# Altium footprint library SparkFun-Retired.PCBLIB: 302 footprints (part 8 of 19)
Each footprint in its own frame and in the unit in brackets; x right, y up, seen from the top. Pads: shape width x height; smd on the part's side, far side on the other; paste and mask are expansions set on the pad; w line width, h text height; cw(c..) or ccw(c..) is an arc to the next point about the centre after c.
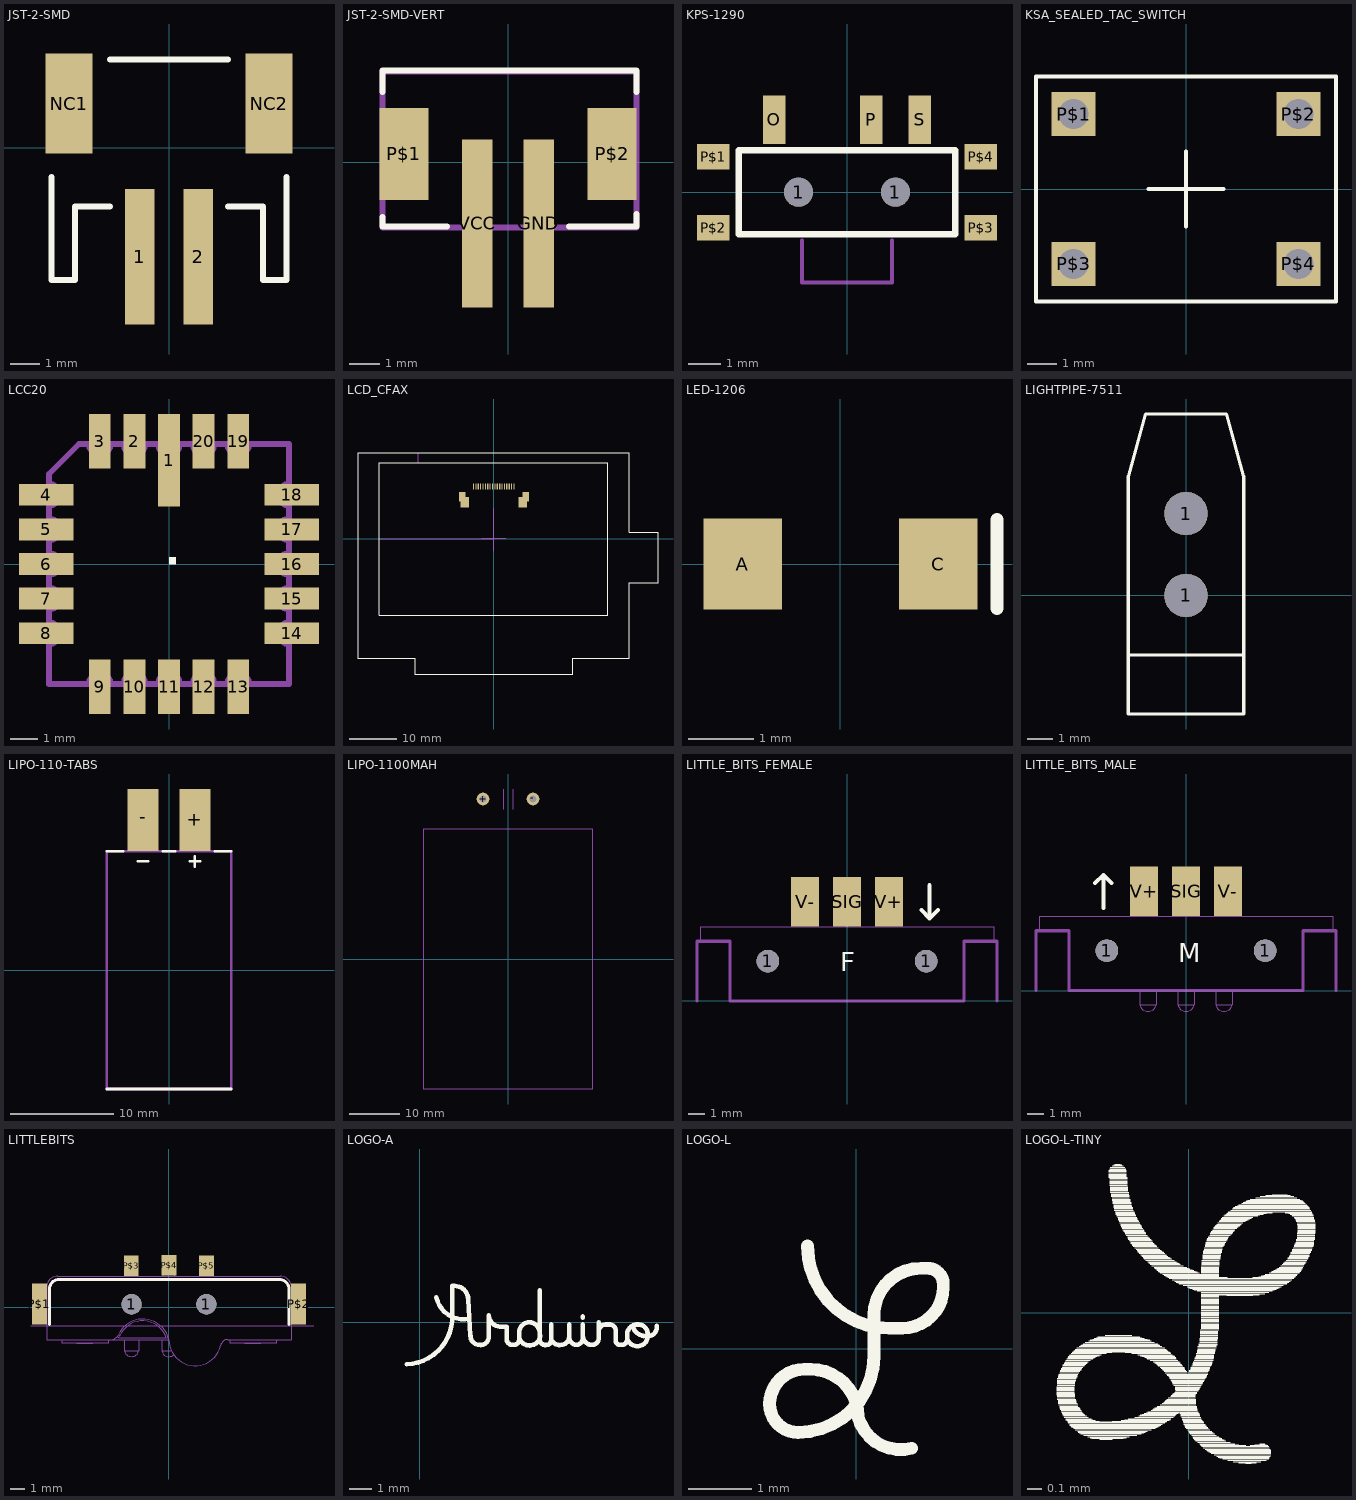
[diagram p7: the footprints below, top view; thin cyan lines are the x and y axes]

## JST-2-SMD [mm]
pads (4):
  rect 1x4.6 smd: 1(-1,-3.7) 2(1,-3.7)
  rect 1.6x3.4 smd: NC1(-3.4,1.5) NC2(3.4,1.5)
Top Overlay:
  lines w0.203: -4,-1 -4,-4.5 -3.2,-4.5 -3.2,-2 -2,-2 ; -2,3 2,3 ; 2,-2 3.2,-2 3.2,-4.5 4,-4.5 4,-1

## JST-2-SMD-VERT [mm]
pads (4):
  rect 1x5.5 smd: GND(1,-2) VCC(-1,-2)
  rect 1.6x3 smd: P$1(-3.4,0.27) P$2(3.4,0.27)
Top Overlay:
  lines w0.203: -4.1,-1.8 -4.1,-2.1 -2,-2.1 ; -4.1,2.3 -4.1,3 4.2,3 4.2,2.3 ; 2,-2.1 4.2,-2.1 4.2,-1.7
Mechanical 16:
  lines w0.203: -4.1,-2.13 4.2,-2.13 4.2,2.97 -4.1,2.97 -4.1,-2.13

## KPS-1290 [mil]
pads (9):
  round 35.43 hole 35.43: 1(-59.06,0) 1(59.06,0)
  rect 27.56x59.06 smd: O(-88.58,88.58) P(29.53,88.58) S(88.58,88.58)
  rect 39.37x31.5 smd: P$1(-163.39,43.31) P$2(-163.39,-43.31) P$3(163.39,-43.31) P$4(163.39,43.31)
Top Overlay:
  lines w8: -131.89,-51.18 -131.89,51.18 131.89,51.18 131.89,-51.18 -131.89,-51.18
Mechanical 16:
  lines w5: -55.12,-59.06 -55.12,-110.24 55.12,-110.24 55.12,-59.06

## KSA_SEALED_TAC_SWITCH [mm]
pads (4):
  rect 1.5x1.5 hole 1: P$1(-3.81,2.54) P$2(3.81,2.54) P$3(-3.81,-2.54) P$4(3.81,-2.54)
Top Overlay:
  lines w0.127: -1.27,0 1.27,0 ; 0,-1.27 0,1.27 ; -5.08,-3.81 5.08,-3.81 5.08,3.81 -5.08,3.81 -5.08,-3.81

## LCC20 [mil]
pads (20):
  rect 31.5x133.86 smd: 1(0,149.61)
  rect 31.5x78.74 smd: 2(-50,177.17) 3(-100,177.17) 9(-100,-177.17) 10(-50,-177.17) 11(0,-177.17) 12(50,-177.17) 13(100,-177.17) 19(100,177.17) 20(50,177.17)
  rect 78.74x31.5 smd: 4(-177.17,100) 5(-177.17,50) 6(-177.17,0) 7(-177.17,-50) 8(-177.17,-100) 14(177.17,-100) 15(177.17,-50) 16(177.17,0) 17(177.17,50) 18(177.17,100)
Top Overlay:
  region: 0,0 10,0 10,10 0,10
Mechanical 16:
  lines w8: -173.23,-173.62 -173.23,-173.23 ; -173.23,-115.75 -173.23,-173.23 ; -173.23,-84.25 -173.23,-65.75 ; -173.23,-34.25 -173.23,-15.75 ; -173.23,15.75 -173.23,34.25 ; -173.23,65.75 -173.23,84.25 ; -173.23,115.75 -173.23,129.92 -129.92,173.23 -115.75,173.23 ; -173.17,-115.75 ccw(c-173.17,-100) -173.17,-84.25 ; -173.17,-65.75 ccw(c-173.17,-50) -173.17,-34.25 ; -173.17,-15.75 ccw(c-173.17,0) -173.17,15.75 ; -173.17,34.25 ccw(c-173.17,50) -173.17,65.75 ; -173.17,84.25 ccw(c-173.17,100) -173.17,115.75 ; -115.75,-173.23 -173.23,-173.23 ; -115.75,-173.17 cw(c-100,-173.17) -84.25,-173.17 ; -115.75,173.17 ccw(c-100,173.17) -84.25,173.17 ; -84.25,-173.23 -65.75,-173.23 ; -84.25,173.23 -65.75,173.23 ; -65.75,-173.17 cw(c-50,-173.17) -34.25,-173.17 ; -65.75,173.17 ccw(c-50,173.17) -34.25,173.17 ; -34.25,-173.23 -15.75,-173.23 ; -34.25,173.23 -15.75,173.23 ; -15.75,-173.17 cw(c0,-173.17) 15.75,-173.17 ; -15.75,173.17 ccw(c0,173.17) 15.75,173.17 ; 15.75,-173.23 34.25,-173.23 ; 15.75,173.23 34.25,173.23 ; 34.25,-173.17 cw(c50,-173.17) 65.75,-173.17 ; 34.25,173.17 ccw(c50,173.17) 65.75,173.17 ; 65.75,-173.23 84.25,-173.23 ; 65.75,173.23 84.25,173.23 ; 84.25,-173.17 cw(c100,-173.17) 115.75,-173.17 ; 84.25,173.17 ccw(c100,173.17) 115.75,173.17 ; 115.75,-173.23 173.23,-173.23 173.23,-115.75 ; 115.75,173.23 173.23,173.23 173.23,115.75 ; 173.17,-115.75 cw(c173.17,-100) 173.17,-84.25 ; 173.17,-65.75 cw(c173.17,-50) 173.17,-34.25 ; 173.17,-15.75 cw(c173.17,0) 173.17,15.75 ; 173.17,34.25 cw(c173.17,50) 173.17,65.75 ; 173.17,84.25 cw(c173.17,100) 173.17,115.75 ; 173.23,-84.25 173.23,-65.75 ; 173.23,-34.25 173.23,-15.75 ; 173.23,15.75 173.23,34.25 ; 173.23,65.75 173.23,84.25

## LCD_CFAX [mm]
pads (22):
  rect 0.25x1.3 smd: P$1(-4.25,11.05) P$2(-3.75,11.05) P$3(-3.25,11.05) P$4(-2.75,11.05) P$5(-2.25,11.05) P$6(-1.75,11.05) P$7(-1.25,11.05) P$8(-0.75,11.05) P$9(-0.25,11.05) P$10(0.25,11.05) P$11(0.75,11.05) P$12(1.25,11.05) P$13(1.75,11.05) P$14(2.25,11.05) P$15(2.75,11.05) P$16(3.25,11.05) P$17(3.75,11.05) P$18(4.25,11.05)
  rect 1.4x2 smd: P$19(-6.6,8.85) P$20(6.7,8.85)
  rect 1.8x2.2 smd: P$21(6.1,7.75) P$22(-6.1,7.75)
Top Overlay:
  lines w0.203: -28.5,-25 -28.5,18 28.5,18 28.5,1.46 34.5,1.46 34.5,-9.175 28.5,-9.175 28.5,-25 16.5,-25 16.5,-28.5 -16.5,-28.5 -16.5,-25 -28.5,-25 ; -24,-16 -24,16 24,16 24,-16 -24,-16
Mechanical 16:
  lines w0.127: -24,0 0,0 ; -15.9,16 -15.9,18 ; -2.54,0 2.54,0 ; 0,-2.54 0,6.54

## LED-1206 [mil]
pads (2):
  rect 47.24x55.12 smd: A(-59.06,0) C(59.06,0)
Top Overlay:
  lines w8: 94.49,-26.87 94.49,26.87

## LIGHTPIPE-7511 [mil]
pads (2):
  round 66 hole 66: 1(0,0) 1(0,125)
Top Overlay:
  lines w5: -88,-91 -88,-181 88,-181 88,-91 ; -88,-91 -88,182 -62,277 62,277 88,182 88,-91 ; -88,-91 88,-91

## LIPO-110-TABS [mm]
pads (2):
  rect 3x6 smd: +(2.5,14.5) -(-2.5,14.5)
Top Overlay:
  lines w0.254: -6,-11.5 6,-11.5 ; -6,11.5 -4.414,11.5 ; -3,10.5 -2,10.5 ; -0.6,11.5 0.586,11.5 ; 2,10.5 3,10.5 ; 2.5,10 2.5,11 ; 4.414,11.5 6,11.5
Mechanical 16:
  rectangle: -3.5,11.5 -1.5,16.5
  rectangle: 1.5,11.5 3.5,16.5
  lines w0.254: -6,-11.5 6,-11.5 6,11.5 -6,11.5 -6,-11.5

## LIPO-1100MAH [mil]
pads (2):
  round 100 hole 55: +(-196.85,1259.84) -(196.85,1259.84)
Mechanical 16:
  lines w5: -39.37,1181.1 -39.37,1338.58 ; 39.37,1181.1 39.37,1338.58
  lines w8: -669.29,-1023.62 669.29,-1023.62 669.29,1023.62 -669.29,1023.62 -669.29,-1023.62

## LITTLE_BITS_FEMALE [mm]
pads (5):
  round 1.37 hole 1.37: 1(-4.79,2.41) 1(4.79,2.41)
  rect 1.7x3 smd: SIG(0,6) V+(2.54,6) V-(-2.54,6)
Top Overlay:
  lines w0.25: 4.5,5.5 5,5 ; 5,7 5,5 ; 5.5,5.5 5,5
  text "F" at -0.4,1.4 h1.97
Mechanical 1:
  lines w0.203: -9.075,0 -9.075,3.61 -7.075,3.61 -7.075,0 7.075,0 7.075,3.61 9.075,3.61 9.075,0
Mechanical 16:
  lines w0.001: -8.875,3.61 -8.875,4.5 8.875,4.5 8.875,3.61

## LITTLE_BITS_MALE [mm]
pads (5):
  round 1.37 hole 1.37: 1(-4.79,2.41) 1(4.79,2.41)
  rect 1.7x3 smd: SIG(0,6) V+(-2.54,6) V-(2.54,6)
Top Overlay:
  lines w0.25: -5.5,6.5 -5,7 ; -5,5 -5,7 ; -4.5,6.5 -5,7
  text "M" at -0.483,1.321 h1.97
Mechanical 1:
  lines w0.203: -9.075,0 -9.075,3.61 -7.075,3.61 -7.075,0 7.075,0 7.075,3.61 9.075,3.61 9.075,0
Mechanical 16:
  lines w0: -2.797,-0.104 -2.797,-0.866 ; -1.806,-0.104 -1.806,-0.866 ; -0.485,-0.104 -0.485,-0.866 ; 0.505,-0.104 0.505,-0.866 ; 1.801,-0.104 1.801,-0.866 ; 2.791,-0.104 2.791,-0.866 ; -2.797,-0.866 -1.806,-0.866 ; -2.797,-0.866 ccw(c-2.301,-0.753) -1.806,-0.866 ; -0.485,-0.866 0.505,-0.866 ; -0.485,-0.866 ccw(c0.01,-0.753) 0.505,-0.866 ; 1.801,-0.866 2.791,-0.866 ; 1.801,-0.866 ccw(c2.296,-0.753) 2.791,-0.866
  lines w0.001: -8.875,3.61 -8.875,4.5 8.875,4.5 8.875,3.61

## LITTLEBITS [mil]
pads (7):
  round 54.09 hole 54.09: 1(-99,8.5) 1(101,8.5)
  rect 40x109 smd: P$1(-346,9.5) P$2(348,9.5)
  rect 40x55 smd: P$3(-100,111.5) P$4(1,112.5) P$5(101,111.5)
Top Overlay:
  lines w8: -319,-45.5 -319,49.5 cw(c-294,49.5) -294,74.5 297,74.5 cw(c297,49.5) 322,49.5 322,-45.5
Mechanical 16:
  circle w1: c-99.19,9.03 r25
  circle w1: c-99.19,9.03 r15
  circle w1: c100.82,9.03 r25
  circle w1: c100.82,9.03 r15
  lines w0: -369,-49.5 389,-49.5 ; -326.69,59.03 -326.69,-40.97 ; -286.69,-85.97 -286.69,-95.97 -161.69,-95.97 -161.69,-85.97 ; -245.85,-95.97 -245.85,-96.97 -204.19,-96.97 -204.19,-95.97 ; -236.48,-96.97 -236.48,-95.97 ; -210.43,-96.97 -210.43,-95.97 ; -137.44,-77.97 -133.44,-80.97 ; -118.69,-85.97 -118.69,-115.97 ; -114.19,84.03 -114.19,134.03 -84.19,134.03 -84.19,84.03 ; -79.69,-85.97 -79.69,-115.97 ; -14.19,84.03 -14.19,134.03 15.82,134.03 15.82,84.03 ; -1.41,-79.42 -5.87,-80.97 ; 0.83,-85.97 0.82,-85.97 ; 7.64,-115.97 -18.69,-115.97 ; 13.94,-126.62 cw(c0.81,-111.52) -18.69,-115.97 ; 85.82,84.03 85.82,134.03 115.82,134.03 115.82,84.03 ; 328.32,-40.97 363.32,-40.97 363.32,-3.47 cw(c363.32,9.03) 363.32,21.53 363.32,59.03 328.32,59.03 ; -326.69,-40.97 -326.69,-85.97 -153.44,-85.97 ; -326.69,-40.97 -361.69,-40.97 -361.69,-3.47 ccw(c-361.69,9.03) -361.69,21.53 -361.69,59.03 -326.26,59.03 cw(c-296.68,54.04) -296.69,84.03 115.82,84.03 ; -153.44,-85.97 -18.69,-85.97 ; -153.44,-85.97 ccw(c-153.44,-65.97) -135.13,-74.02 ; -135.13,-74.02 -130.56,-76.03 ; -135.13,-74.02 -135.14,-74.02 ; -135.14,-74.02 cw(c-69.18,-103.02) 0.82,-85.97 ; -133.44,-80.97 -5.87,-80.97 ; -133.44,-80.97 ccw(c-153.44,-66) -130.56,-76.03 ; -130.56,-76.03 cw(c-69.19,-103.02) -5.87,-80.97 ; -118.69,-115.97 -79.69,-115.97 ; -118.69,-115.97 ccw(c-99.19,-111.53) -79.69,-115.97 ; -18.69,-115.97 -18.69,-85.97 ; -18.69,-85.97 0.82,-85.97 ; 0.82,-85.97 ccw(c70.81,-85.97) 139.06,-101.52 cw(c158.57,-105.97) 158.57,-85.97 163.32,-85.97 ; 115.82,84.03 298.32,84.03 cw(c298.31,54.03) 327.9,59.03 328.32,59.03 ; 163.32,-85.97 288.32,-85.97 ; 163.32,-85.97 163.32,-95.97 204.15,-95.97 ; 204.15,-95.97 213.52,-95.97 ; 204.15,-95.97 204.15,-96.97 213.52,-96.97 ; 213.52,-96.97 239.57,-96.97 ; 213.52,-96.97 213.52,-95.97 ; 213.52,-95.97 239.57,-95.97 ; 239.57,-96.97 245.82,-96.97 245.82,-95.97 ; 239.57,-96.97 239.57,-95.97 ; 239.57,-95.97 245.82,-95.97 ; 245.82,-95.97 288.32,-95.97 288.32,-85.97 ; 288.32,-85.97 328.32,-85.97 328.32,59.03

## LOGO-A [mil]
Top Overlay:
  lines w8: -22.44,-72.83 ccw(c-25.39,8.86) 56.3,11.81 56.3,62.99 60.24,62.99 cw(c60.24,39.37) 83.86,39.37 87.8,-23.62 ccw(c103.55,-23.62) 103.54,-39.37 ccw(c105.51,-25.59) 119.29,-27.56 119.29,11.81 ccw(c140.94,13.78) 142.91,-7.87 150.79,-7.87 150.79,-29.53 ccw(c160.63,-29.53) 160.63,-39.37 ; 28.74,43.31 ccw(c75.98,53.16) 85.83,5.91 ; 162.6,-39.37 ccw(c162.6,-29.53) 172.44,-29.53 172.44,-27.56 ; 207.87,-23.62 207.87,55.12 ; 227.56,-31.5 cw(c219.69,-31.5) 219.69,-39.37 cw(c217.72,-29.52) 207.87,-31.5 207.87,-27.56 ; 227.56,-3.94 227.56,-27.56 ccw(c242.32,-24.61) 245.28,-39.37 ccw(c244.29,-24.61) 259.06,-23.62 ; 259.06,-3.94 259.06,-23.62 ; 282.68,-3.94 282.68,-21.65 ; 282.68,7.87 282.68,9.84 ; 310.24,0 310.24,-27.56 ; 359.45,-27.56 cw(c349.61,-29.52) 351.57,-39.37 345.67,-39.37 cw(c347.63,-31.5) 339.76,-29.53 339.76,-13.78 ccw(c328.94,-14.77) 327.95,-3.94 322.05,-3.94 ccw(c322.05,-15.75) 310.24,-15.75 310.24,-27.56 ; 369.29,-5.91 ccw(c390.94,-1.97) 394.88,-23.62 ; 410.63,-5.91 410.63,-11.81 cw(c395.87,-8.86) 392.91,-23.62 394.88,-23.62 ; 172.44,-27.56 172.44,-17.72 cw(c190.16,-17.72) 190.16,0 cw(c189.17,-18.7) 207.87,-19.69 cw(c192.13,-23.62) 207.87,-27.56 ; 172.44,-27.56 ccw(c190.16,-21.66) 196.06,-39.37 ccw(c192.12,-23.62) 207.87,-27.56 ; 259.06,-23.62 ccw(c272.84,-25.59) 270.87,-39.37 ccw(c270.87,-27.56) 282.68,-27.56 282.68,-21.65 ; 282.68,-21.65 282.68,-23.62 ccw(c298.43,-23.62) 298.43,-39.37 ccw(c298.43,-27.56) 310.24,-27.56 ; 394.88,-23.62 394.88,-19.69 ccw(c379.13,-19.69) 379.13,-3.94 375.2,-3.94 ccw(c377.17,-21.66) 359.45,-23.62 ccw(c376.19,-24.61) 375.2,-41.34 379.13,-41.34 ccw(c378.14,-24.61) 394.88,-23.62

## LOGO-L [mil]
Top Overlay:
  lines w8: -30.44,63.95 ccw(c20.74,63.95) 20.74,12.77 28.61,12.77 ccw(c28.61,38.36) 54.2,38.36 54.2,40.33 ccw(c44.36,40.33) 44.36,50.17 40.43,50.17 ccw(c40.42,20.64) 10.9,20.65 10.9,-4.94 cw(c-36.35,-4.94) -36.35,-52.19 cw(c-36.34,-34.48) -54.06,-34.47 cw(c-32.41,-34.47) -32.41,-12.82 -28.47,-12.82 cw(c-28.47,-42.35) 1.06,-42.35 ccw(c27.63,-35.46) 34.52,-62.03

## LOGO-L-TINY [mil]
Top Overlay:
  drawing of 747 lines, arcs and shapes, not listed